# Altium footprint library BBC_Connectors.PcbLib: 141 footprints (part 2 of 9)
Each footprint in its own frame and in the unit in brackets; x right, y up, seen from the top. Pads: shape width x height; smd on the part's side, far side on the other; paste and mask are expansions set on the pad; w line width, h text height; cw(c..) or ccw(c..) is an arc to the next point about the centre after c.
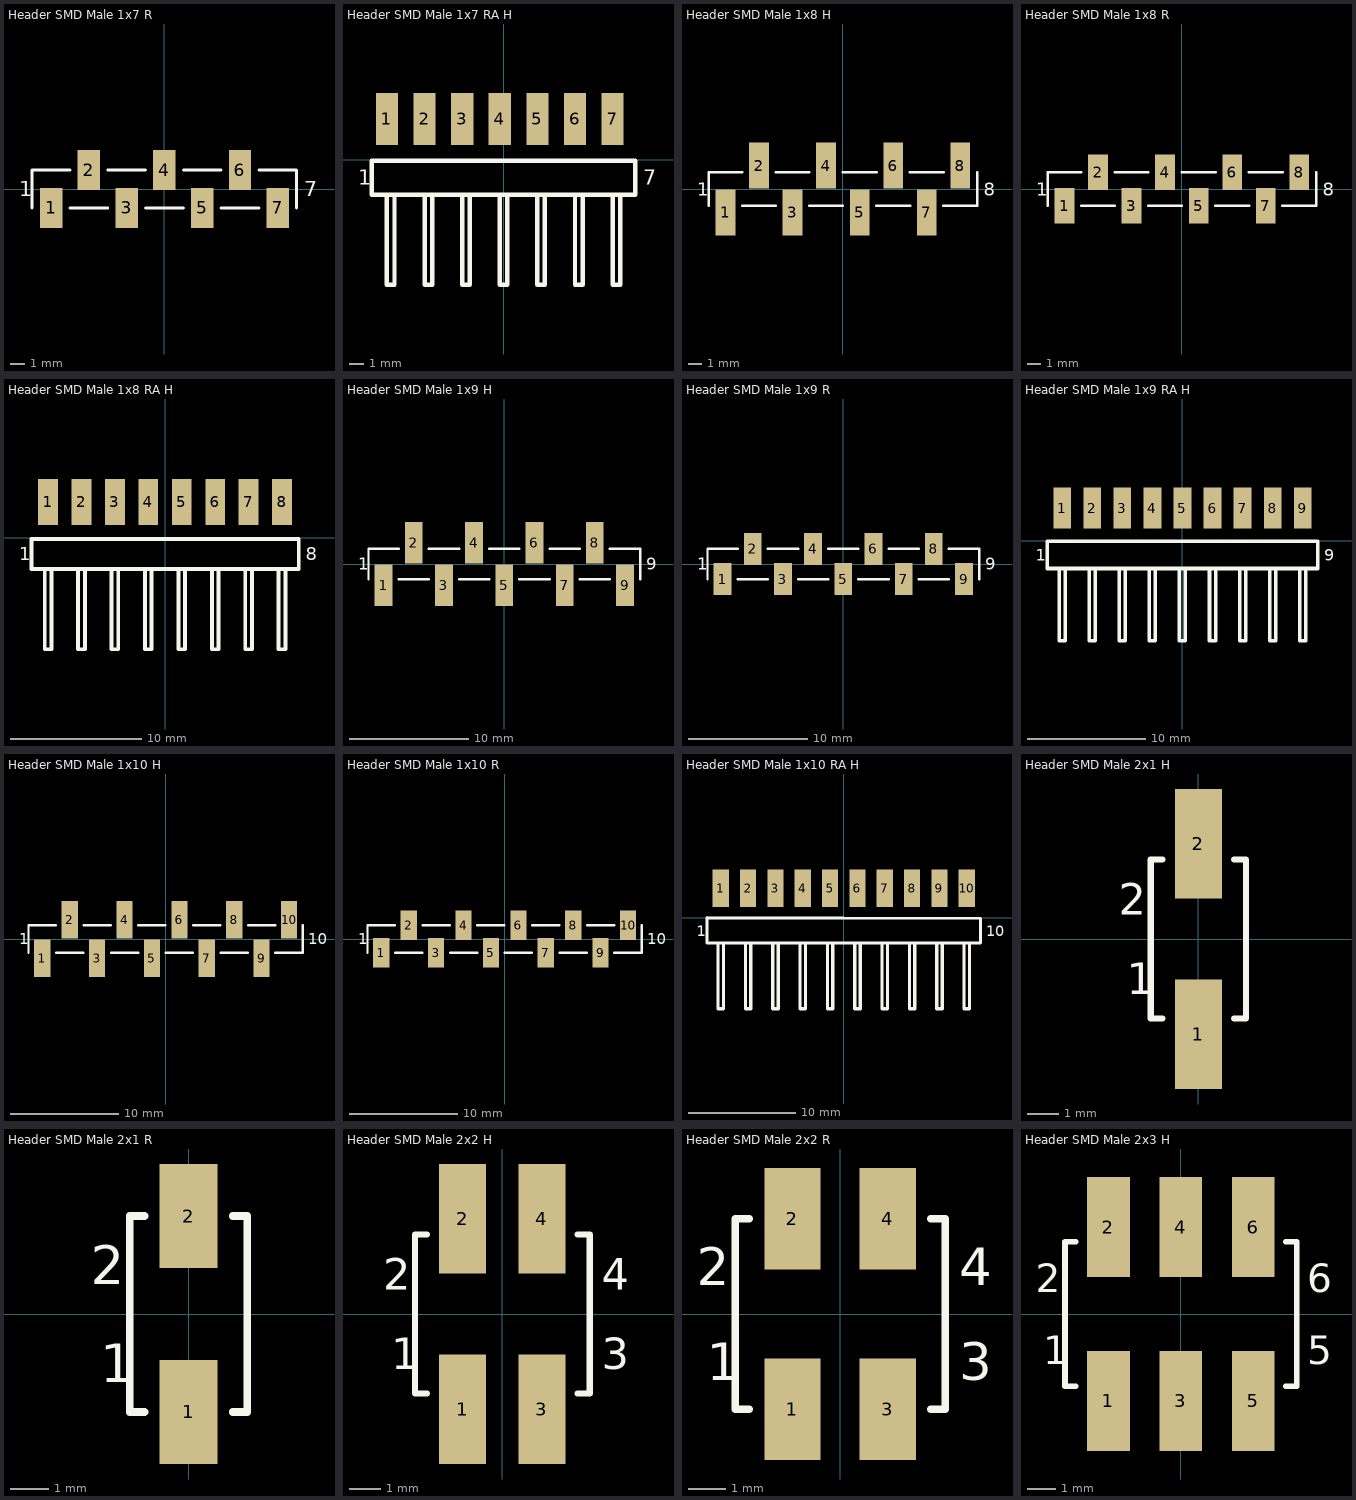
[diagram p1: the footprints below, top view; thin cyan lines are the x and y axes]

## Header SMD Male 1x7 R [mm] "male header for smd mounting / pitch = 2.54mm / reflow soldering"
height 11
pads (7):
  rect 1.5x2.7 smd: 1(-7.62,-1.27) 2(-5.08,1.27) 3(-2.54,-1.27) 4(0,1.27) 5(2.54,-1.27) 6(5.08,1.27) 7(7.62,-1.27)
Top Overlay:
  lines w0.2: -8.89,-1.27 -8.89,1.27 -6.35,1.27 ; -6.35,-1.27 -3.81,-1.27 ; -3.81,1.27 -1.27,1.27 ; -1.27,-1.27 1.27,-1.27 ; 1.27,1.27 3.81,1.27 ; 3.81,-1.27 6.35,-1.27 ; 6.35,1.27 8.89,1.27 8.89,-1.27
  text "1" at -9.779,-0.5 h1
  text "7" at 9.398,-0.5 h1
3D body "Header SMD Male 1x7.step": height 8.78, standoff -0.04, extent -8.922,-2.412 8.858,2.436

## Header SMD Male 1x7 RA H [mm] "right angled male header for smd mounting / pitch = 2.54mm / hand soldering"
height 11
pads (7):
  rect 1.5x3.5 smd: 1(-7.874,2.75) 2(-5.334,2.75) 3(-2.794,2.75) 4(-0.254,2.75) 5(2.286,2.75) 6(4.826,2.75) 7(7.366,2.75)
Top Overlay:
  lines w0.3: -7.874,-2.36 -7.874,-8.456 -7.366,-8.456 -7.366,-2.36 ; -5.334,-2.36 -5.334,-8.456 -4.826,-8.456 -4.826,-2.36 ; -2.794,-2.36 -2.794,-8.456 -2.286,-8.456 -2.286,-2.36 ; -0.254,-2.36 -0.254,-8.456 0.254,-8.456 0.254,-2.36 ; 2.286,-2.36 2.286,-8.456 2.794,-8.456 2.794,-2.36 ; 4.826,-2.36 4.826,-8.456 5.334,-8.456 5.334,-2.36 ; 7.366,-2.36 7.366,-8.456 7.874,-8.456 7.874,-2.36 ; -8.89,-2.36 8.89,-2.36 8.89,-0.074 -8.89,-0.074 -8.89,-2.36
  text "1" at -9.83,-1.7 h1
  text "7" at 9.43,-1.7 h1
3D body "Header SMD Male 1x7 RA.stp": height 2.52, standoff 0.02, extent -8.89,-8.5 8.89,3

## Header SMD Male 1x8 H [mm] "male header for smd mounting / pitch = 2.54mm / hand soldering"
height 11
pads (8):
  rect 1.5x3.5 smd: 1(-8.89,-1.778) 2(-6.35,1.778) 3(-3.81,-1.778) 4(-1.27,1.778) 5(1.27,-1.778) 6(3.81,1.778) 7(6.35,-1.778) 8(8.89,1.778)
Top Overlay:
  lines w0.2: -10.16,-1.27 -10.16,1.27 -7.62,1.27 ; -7.62,-1.27 -5.08,-1.27 ; -5.08,1.27 -2.54,1.27 ; -2.54,-1.27 0,-1.27 ; 0,1.27 2.54,1.27 ; 2.54,-1.27 5.08,-1.27 ; 5.08,1.27 7.62,1.27 ; 7.62,-1.27 10.16,-1.27 10.16,1.27
  text "1" at -11.049,-0.5 h1
  text "8" at 10.668,-0.5 h1
3D body "Header SMD Male 1x8.step": height 8.78, standoff -0.04, extent -10.192,-2.412 10.128,2.436

## Header SMD Male 1x8 R [mm] "male header for smd mounting / pitch = 2.54mm / reflow soldering"
height 11
pads (8):
  rect 1.5x2.7 smd: 1(-8.89,-1.27) 2(-6.35,1.27) 3(-3.81,-1.27) 4(-1.27,1.27) 5(1.27,-1.27) 6(3.81,1.27) 7(6.35,-1.27) 8(8.89,1.27)
Top Overlay:
  lines w0.2: -10.16,-1.27 -10.16,1.27 -7.62,1.27 ; -7.62,-1.27 -5.08,-1.27 ; -5.08,1.27 -2.54,1.27 ; -2.54,-1.27 0,-1.27 ; 0,1.27 2.54,1.27 ; 2.54,-1.27 5.08,-1.27 ; 5.08,1.27 7.62,1.27 ; 7.62,-1.27 10.16,-1.27 10.16,1.27
  text "8" at 10.668,-0.5 h1
  text "1" at -11.049,-0.5 h1
3D body "Header SMD Male 1x8.step": height 8.78, standoff -0.04, extent -10.192,-2.412 10.128,2.436

## Header SMD Male 1x8 RA H [mm] "right angled male header for smd mounting / pitch = 2.54mm / hand soldering"
height 11
pads (8):
  rect 1.5x3.5 smd: 1(-8.89,2.75) 2(-6.35,2.75) 3(-3.81,2.75) 4(-1.27,2.75) 5(1.27,2.75) 6(3.81,2.75) 7(6.35,2.75) 8(8.89,2.75)
Top Overlay:
  lines w0.3: -9.144,-2.36 -9.144,-8.456 -8.636,-8.456 -8.636,-2.36 ; -6.604,-2.36 -6.604,-8.456 -6.096,-8.456 -6.096,-2.36 ; -4.064,-2.36 -4.064,-8.456 -3.556,-8.456 -3.556,-2.36 ; -1.524,-2.36 -1.524,-8.456 -1.016,-8.456 -1.016,-2.36 ; 1.016,-2.36 1.016,-8.456 1.524,-8.456 1.524,-2.36 ; 3.556,-2.36 3.556,-8.456 4.064,-8.456 4.064,-2.36 ; 6.096,-2.36 6.096,-8.456 6.604,-8.456 6.604,-2.36 ; 8.636,-2.36 8.636,-8.456 9.144,-8.456 9.144,-2.36 ; -10.16,-2.36 10.16,-2.36 10.16,-0.074 -10.16,-0.074 -10.16,-2.36
  text "1" at -11.1,-1.7 h1
  text "8" at 10.7,-1.7 h1
3D body "pin_header_a-sl254-ea-g08mp1.stp": height 2.52, standoff 0.02, extent -10.16,-8.5 10.16,3

## Header SMD Male 1x9 H [mm] "male header for smd mounting / pitch = 2.54mm / hand soldering"
height 11
pads (9):
  rect 1.5x3.5 smd: 1(-10.16,-1.778) 2(-7.62,1.778) 3(-5.08,-1.778) 4(-2.54,1.778) 5(0,-1.778) 6(2.54,1.778) 7(5.08,-1.778) 8(7.62,1.778) 9(10.16,-1.778)
Top Overlay:
  lines w0.2: -11.43,-1.27 -11.43,1.27 -8.89,1.27 ; -8.89,-1.27 -6.35,-1.27 ; -6.35,1.27 -3.81,1.27 ; -3.81,-1.27 -1.27,-1.27 ; -1.27,1.27 1.27,1.27 ; 1.27,-1.27 3.81,-1.27 ; 3.81,1.27 6.35,1.27 ; 6.35,-1.27 8.89,-1.27 ; 8.89,1.27 11.43,1.27 11.43,-1.27
  text "9" at 11.938,-0.5 h1
  text "1" at -12.319,-0.5 h1
3D body "Header SMD Male 1x9.step": height 8.78, standoff -0.04, extent -11.462,-2.412 11.398,2.436

## Header SMD Male 1x9 R [mm] "male header for smd mounting / pitch = 2.54mm / reflow soldering"
height 11
pads (9):
  rect 1.5x2.7 smd: 1(-10.16,-1.27) 2(-7.62,1.27) 3(-5.08,-1.27) 4(-2.54,1.27) 5(0,-1.27) 6(2.54,1.27) 7(5.08,-1.27) 8(7.62,1.27) 9(10.16,-1.27)
Top Overlay:
  lines w0.2: -11.43,-1.27 -11.43,1.27 -8.89,1.27 ; -8.89,-1.27 -6.35,-1.27 ; -6.35,1.27 -3.81,1.27 ; -3.81,-1.27 -1.27,-1.27 ; -1.27,1.27 1.27,1.27 ; 1.27,-1.27 3.81,-1.27 ; 3.81,1.27 6.35,1.27 ; 6.35,-1.27 8.89,-1.27 ; 8.89,1.27 11.43,1.27 11.43,-1.27
  text "9" at 11.938,-0.5 h1
  text "1" at -12.319,-0.5 h1
3D body "Header SMD Male 1x9.step": height 8.78, standoff -0.04, extent -11.462,-2.412 11.398,2.436

## Header SMD Male 1x9 RA H [mm] "right angled male header for smd mounting / pitch = 2.54mm / hand soldering"
height 11
pads (9):
  rect 1.5x3.5 smd: 1(-10.16,2.75) 2(-7.62,2.75) 3(-5.08,2.75) 4(-2.54,2.75) 5(0,2.75) 6(2.54,2.75) 7(5.08,2.75) 8(7.62,2.75) 9(10.16,2.75)
Top Overlay:
  lines w0.3: -10.414,-2.36 -10.414,-8.456 -9.906,-8.456 -9.906,-2.36 ; -7.874,-2.36 -7.874,-8.456 -7.366,-8.456 -7.366,-2.36 ; -5.334,-2.36 -5.334,-8.456 -4.826,-8.456 -4.826,-2.36 ; -2.794,-2.36 -2.794,-8.456 -2.286,-8.456 -2.286,-2.36 ; -0.254,-2.36 -0.254,-8.456 0.254,-8.456 0.254,-2.36 ; 2.286,-2.36 2.286,-8.456 2.794,-8.456 2.794,-2.36 ; 4.826,-2.36 4.826,-8.456 5.334,-8.456 5.334,-2.36 ; 7.366,-2.36 7.366,-8.456 7.874,-8.456 7.874,-2.36 ; 9.906,-2.36 9.906,-8.456 10.414,-8.456 10.414,-2.36 ; -11.43,-2.36 11.43,-2.36 11.43,-0.074 -11.43,-0.074 -11.43,-2.36
  text "9" at 11.97,-1.7 h1
  text "1" at -12.37,-1.7 h1
3D body "Header SMD Male 1x9 RA.stp": height 2.52, standoff 0.02, extent -11.43,-8.5 11.43,3

## Header SMD Male 1x10 H [mm] "male header for smd mounting / pitch = 2.54mm / hand soldering"
height 11
pads (10):
  rect 1.5x3.5 smd: 1(-11.43,-1.778) 2(-8.89,1.778) 3(-6.35,-1.778) 4(-3.81,1.778) 5(-1.27,-1.778) 6(1.27,1.778) 7(3.81,-1.778) 8(6.35,1.778) 9(8.89,-1.778) 10(11.43,1.778)
Top Overlay:
  lines w0.2: -12.7,-1.27 -12.7,1.27 -10.16,1.27 ; -10.16,-1.27 -7.62,-1.27 ; -7.62,1.27 -5.08,1.27 ; -5.08,-1.27 -2.54,-1.27 ; -2.54,1.27 0,1.27 ; 0,-1.27 2.54,-1.27 ; 2.54,1.27 5.08,1.27 ; 5.08,-1.27 7.62,-1.27 ; 7.62,1.27 10.16,1.27 ; 10.16,-1.27 12.7,-1.27 12.7,1.27
  text "10" at 13.208,-0.5 h1
  text "1" at -13.589,-0.5 h1
3D body "Header SMD Male 1x10.step": height 8.78, standoff -0.04, extent -12.732,-2.412 12.668,2.436

## Header SMD Male 1x10 R [mm] "male header for smd mounting / pitch = 2.54mm / reflow soldering"
height 11
pads (10):
  rect 1.5x2.7 smd: 1(-11.43,-1.27) 2(-8.89,1.27) 3(-6.35,-1.27) 4(-3.81,1.27) 5(-1.27,-1.27) 6(1.27,1.27) 7(3.81,-1.27) 8(6.35,1.27) 9(8.89,-1.27) 10(11.43,1.27)
Top Overlay:
  lines w0.2: -12.7,-1.27 -12.7,1.27 -10.16,1.27 ; -10.16,-1.27 -7.62,-1.27 ; -7.62,1.27 -5.08,1.27 ; -5.08,-1.27 -2.54,-1.27 ; -2.54,1.27 0,1.27 ; 0,-1.27 2.54,-1.27 ; 2.54,1.27 5.08,1.27 ; 5.08,-1.27 7.62,-1.27 ; 7.62,1.27 10.16,1.27 ; 10.16,-1.27 12.7,-1.27 12.7,1.27
  text "1" at -13.589,-0.5 h1
  text "10" at 13.208,-0.5 h1
3D body "Header SMD Male 1x10.step": height 8.78, standoff -0.04, extent -12.732,-2.412 12.668,2.436

## Header SMD Male 1x10 RA H [mm] "right angled male header for smd mounting / pitch = 2.54mm / hand soldering"
height 11
pads (10):
  rect 1.5x3.5 smd: 1(-11.43,2.75) 2(-8.89,2.75) 3(-6.35,2.75) 4(-3.81,2.75) 5(-1.27,2.75) 6(1.27,2.75) 7(3.81,2.75) 8(6.35,2.75) 9(8.89,2.75) 10(11.43,2.75)
Top Overlay:
  lines w0.3: -12.7,-0.074 -12.7,-2.36 12.7,-2.36 12.7,-0.074 ; -12.7,0 12.7,-0.082 ; -11.684,-2.36 -11.684,-8.456 -11.176,-8.456 -11.176,-2.36 ; -9.144,-2.36 -9.144,-8.456 -8.636,-8.456 -8.636,-2.36 ; -6.604,-2.36 -6.604,-8.456 -6.096,-8.456 -6.096,-2.36 ; -4.064,-2.36 -4.064,-8.456 -3.556,-8.456 -3.556,-2.36 ; -1.524,-2.36 -1.524,-8.456 -1.016,-8.456 -1.016,-2.36 ; 1.016,-2.36 1.016,-8.456 1.524,-8.456 1.524,-2.36 ; 3.556,-2.36 3.556,-8.456 4.064,-8.456 4.064,-2.36 ; 6.096,-2.36 6.096,-8.456 6.604,-8.456 6.604,-2.36 ; 8.636,-2.36 8.636,-8.456 9.144,-8.456 9.144,-2.36 ; 11.176,-2.36 11.176,-8.456 11.684,-8.456 11.684,-2.36
  text "10" at 13.24,-1.7 h1
  text "1" at -13.64,-1.7 h1
3D body "Header SMD Male 1x10 RA.stp": height 2.52, standoff 0.02, extent -12.7,-8.5 12.7,3

## Header SMD Male 2x1 H [mm] "male header for smd mounting / pitch = 2.54mm / hand soldering"
height 11
pads (2):
  rect 1.5x3.5 smd: 1(0,-3.048) 2(0,3.048)
Top Overlay:
  lines w0.2: -1.143,-2.54 -1.524,-2.54 -1.524,2.54 -1.143,2.54 ; 1.143,-2.54 1.524,-2.54 1.524,2.54 1.143,2.54
  text "2" at -2.54,0.77 h1
  text "1" at -2.286,-1.77 h1
3D body "Header SMD Male 2x1.step": height 8.78, standoff -0.04, extent -1.27,-3.694 1.27,3.694

## Header SMD Male 2x1 R [mm] "male header for smd mounting / pitch = 2.54mm / reflow soldering"
height 11
pads (2):
  rect 1.5x2.7 smd: 1(0,-2.54) 2(0,2.54)
Top Overlay:
  lines w0.2: -1.143,-2.54 -1.524,-2.54 -1.524,2.54 -1.143,2.54 ; 1.143,-2.54 1.524,-2.54 1.524,2.54 1.143,2.54
  text "1" at -2.286,-1.77 h1
  text "2" at -2.54,0.77 h1
3D body "Header SMD Male 2x1.step": height 8.78, standoff -0.04, extent -1.27,-3.694 1.27,3.694

## Header SMD Male 2x2 H [mm] "male header for smd mounting / pitch = 2.54mm / hand soldering"
height 11
pads (4):
  rect 1.5x3.5 smd: 1(-1.27,-3.048) 2(-1.27,3.048) 3(1.27,-3.048) 4(1.27,3.048)
Top Overlay:
  lines w0.2: -2.413,-2.54 -2.794,-2.54 -2.794,2.54 -2.413,2.54 ; 2.413,-2.54 2.794,-2.54 2.794,2.54 2.413,2.54
  text "1" at -3.556,-1.77 h1
  text "2" at -3.81,0.77 h1
  text "4" at 3.175,0.77 h1
  text "3" at 3.175,-1.77 h1
3D body "Header SMD Male 2x2.step": height 8.78, standoff -0.04, extent -2.54,-3.694 2.54,3.694

## Header SMD Male 2x2 R [mm] "male header for smd mounting / pitch = 2.54mm / reflow soldering"
height 11
pads (4):
  rect 1.5x2.7 smd: 1(-1.27,-2.54) 2(-1.27,2.54) 3(1.27,-2.54) 4(1.27,2.54)
Top Overlay:
  lines w0.2: -2.413,-2.54 -2.794,-2.54 -2.794,2.54 -2.413,2.54 ; 2.413,-2.54 2.794,-2.54 2.794,2.54 2.413,2.54
  text "3" at 3.175,-1.77 h1
  text "4" at 3.175,0.77 h1
  text "2" at -3.81,0.77 h1
  text "1" at -3.556,-1.77 h1
3D body "Header SMD Male 2x2.step": height 8.78, standoff -0.04, extent -2.54,-3.694 2.54,3.694

## Header SMD Male 2x3 H [mm] "male header for smd mounting / pitch = 2.54mm / hand soldering"
height 11
pads (6):
  rect 1.5x3.5 smd: 1(-2.54,-3.048) 2(-2.54,3.048) 3(0,-3.048) 4(0,3.048) 5(2.54,-3.048) 6(2.54,3.048)
Top Overlay:
  lines w0.2: -3.683,-2.54 -4.064,-2.54 -4.064,2.54 -3.683,2.54 ; 3.683,-2.54 4.064,-2.54 4.064,2.54 3.683,2.54
  text "1" at -4.826,-1.77 h1
  text "2" at -5.08,0.77 h1
  text "6" at 4.445,0.77 h1
  text "5" at 4.445,-1.77 h1
3D body "Header SMD Male 2x3.step": height 8.78, standoff -0.04, extent -3.81,-3.694 3.81,3.694